# Altium footprint library 15EDG.PcbLib: 46 footprints (part 2 of 3)
Each footprint in its own frame and in the unit in brackets; x right, y up, seen from the top. Pads: shape width x height; smd on the part's side, far side on the other; paste and mask are expansions set on the pad; w line width, h text height; cw(c..) or ccw(c..) is an arc to the next point about the centre after c.
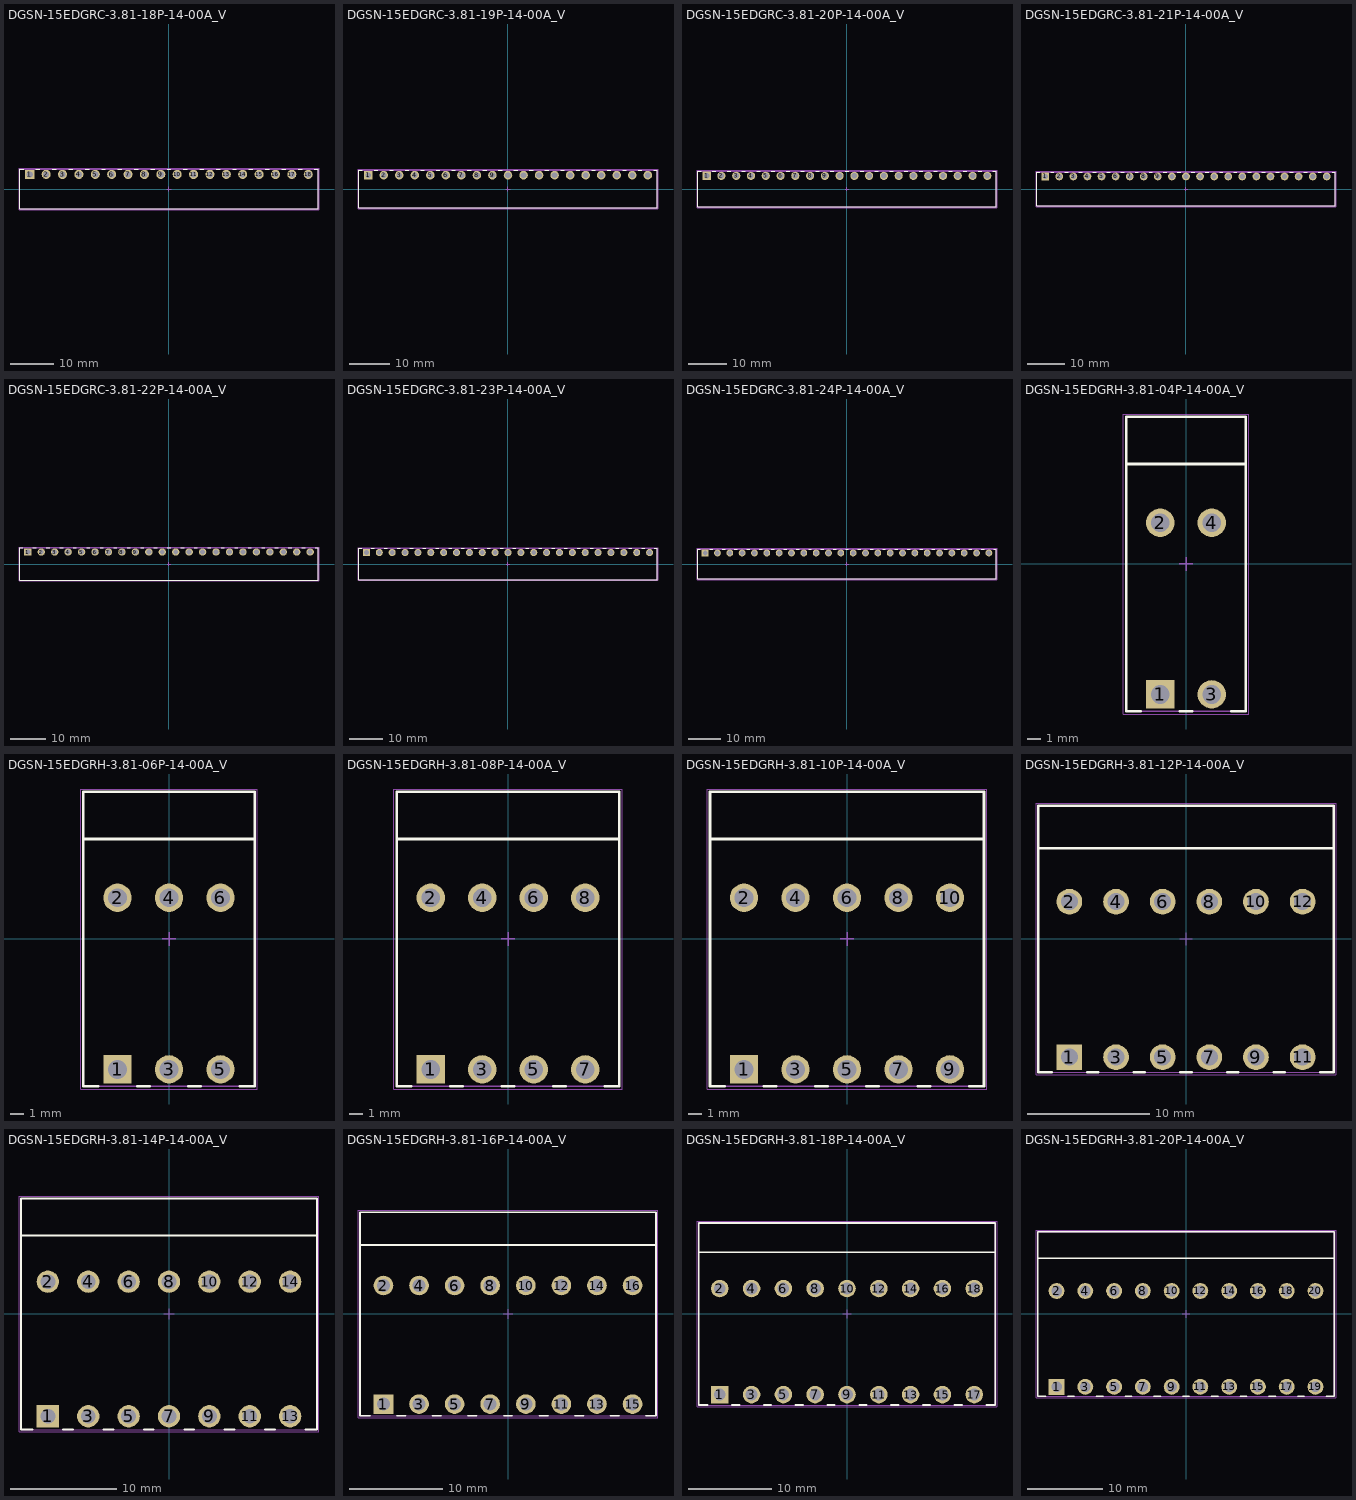
[diagram p1: the footprints below, top view; thin cyan lines are the x and y axes]

## DGSN-15EDGRC-3.81-18P-14-00A_V [mm] "Terminal Block, 18-Pin, Body 69.37x9.2mm, Pitch 3.81mm"
height 7.24
pads (18):
  rect 2.1x2.1 hole 1.4: 1(-32.385,3.4)
  round 2.1 hole 1.4: 2(-28.575,3.4) 3(-24.765,3.4) 4(-20.955,3.4) 5(-17.145,3.4) 6(-13.335,3.4) 7(-9.525,3.4) 8(-5.715,3.4) 9(-1.905,3.4) 10(1.905,3.4) 11(5.715,3.4) 12(9.525,3.4) 13(13.335,3.4) 14(17.145,3.4) 15(20.955,3.4) 16(24.765,3.4) 17(28.575,3.4) 18(32.385,3.4)
Top Overlay:
  lines w0.2: -33.835,4.6 -34.685,4.6 -34.685,-4.6 34.685,-4.6 34.685,4.6 33.835,4.6 ; -30.935,4.6 -30.025,4.6 ; -27.125,4.6 -26.215,4.6 ; -23.315,4.6 -22.405,4.6 ; -19.505,4.6 -18.595,4.6 ; -15.695,4.6 -14.785,4.6 ; -11.885,4.6 -10.975,4.6 ; -8.075,4.6 -7.165,4.6 ; -4.265,4.6 -3.355,4.6 ; -0.455,4.6 0.455,4.6 ; 3.355,4.6 4.265,4.6 ; 7.165,4.6 8.075,4.6 ; 10.975,4.6 11.885,4.6 ; 14.785,4.6 15.695,4.6 ; 18.595,4.6 19.505,4.6 ; 22.405,4.6 23.315,4.6 ; 26.215,4.6 27.125,4.6 ; 30.025,4.6 30.935,4.6
Mechanical 13:
  lines w0.1: -34.685,-4.6 34.685,-4.6 34.685,4.6 -34.685,4.6 -34.685,-4.6
Mechanical 15:
  lines w0.05: -34.885,-4.8 -34.885,4.8 ; -34.885,-4.8 34.885,-4.8 34.885,4.8 -34.885,4.8
  lines w0.1: -0.5,0 0.5,0 ; 0,-0.5 0,0.5
3D body "15EDGRC-3.81-18P-14-00AH.STEP": height 7.2, standoff -3.4, extent -34.685,-4.6 34.685,4.6

## DGSN-15EDGRC-3.81-19P-14-00A_V [mm] "Terminal Block, 19-Pin, Body 73.18x9.2mm, Pitch 3.81mm"
height 7.24
pads (19):
  rect 2.1x2.1 hole 1.4: 1(-34.29,3.4)
  round 2.1 hole 1.4: 2(-30.48,3.4) 3(-26.67,3.4) 4(-22.86,3.4) 5(-19.05,3.4) 6(-15.24,3.4) 7(-11.43,3.4) 8(-7.62,3.4) 9(-3.81,3.4) 10(0,3.4) 11(3.81,3.4) 12(7.62,3.4) 13(11.43,3.4) 14(15.24,3.4) 15(19.05,3.4) 16(22.86,3.4) 17(26.67,3.4) 18(30.48,3.4) 19(34.29,3.4)
Top Overlay:
  lines w0.2: -35.74,4.6 -36.59,4.6 -36.59,-4.6 36.59,-4.6 36.59,4.6 35.74,4.6 ; -32.84,4.6 -31.93,4.6 ; -29.03,4.6 -28.12,4.6 ; -25.22,4.6 -24.31,4.6 ; -21.41,4.6 -20.5,4.6 ; -17.6,4.6 -16.69,4.6 ; -13.79,4.6 -12.88,4.6 ; -9.98,4.6 -9.07,4.6 ; -6.17,4.6 -5.26,4.6 ; -2.36,4.6 -1.45,4.6 ; 1.45,4.6 2.36,4.6 ; 5.26,4.6 6.17,4.6 ; 9.07,4.6 9.98,4.6 ; 12.88,4.6 13.79,4.6 ; 16.69,4.6 17.6,4.6 ; 20.5,4.6 21.41,4.6 ; 24.31,4.6 25.22,4.6 ; 28.12,4.6 29.03,4.6 ; 31.93,4.6 32.84,4.6
Mechanical 13:
  lines w0.1: -36.59,-4.6 36.59,-4.6 36.59,4.6 -36.59,4.6 -36.59,-4.6
Mechanical 15:
  lines w0.05: -36.79,-4.8 -36.79,4.8 ; -36.79,-4.8 36.79,-4.8 36.79,4.8 -36.79,4.8
  lines w0.1: -0.5,0 0.5,0 ; 0,-0.5 0,0.5
3D body "15EDGRC-3.81-19P-14-00AH.STEP": height 7.2, standoff -3.4, extent -36.59,-4.6 36.59,4.6

## DGSN-15EDGRC-3.81-20P-14-00A_V [mm] "Terminal Block, 20-Pin, Body 76.99x9.2mm, Pitch 3.81mm"
height 7.24
pads (20):
  rect 2.1x2.1 hole 1.4: 1(-36.195,3.4)
  round 2.1 hole 1.4: 2(-32.385,3.4) 3(-28.575,3.4) 4(-24.765,3.4) 5(-20.955,3.4) 6(-17.145,3.4) 7(-13.335,3.4) 8(-9.525,3.4) 9(-5.715,3.4) 10(-1.905,3.4) 11(1.905,3.4) 12(5.715,3.4) 13(9.525,3.4) 14(13.335,3.4) 15(17.145,3.4) 16(20.955,3.4) 17(24.765,3.4) 18(28.575,3.4) 19(32.385,3.4) 20(36.195,3.4)
Top Overlay:
  lines w0.2: -37.645,4.6 -38.495,4.6 -38.495,-4.6 38.495,-4.6 38.495,4.6 37.645,4.6 ; -34.745,4.6 -33.835,4.6 ; -30.935,4.6 -30.025,4.6 ; -27.125,4.6 -26.215,4.6 ; -23.315,4.6 -22.405,4.6 ; -19.505,4.6 -18.595,4.6 ; -15.695,4.6 -14.785,4.6 ; -11.885,4.6 -10.975,4.6 ; -8.075,4.6 -7.165,4.6 ; -4.265,4.6 -3.355,4.6 ; -0.455,4.6 0.455,4.6 ; 3.355,4.6 4.265,4.6 ; 7.165,4.6 8.075,4.6 ; 10.975,4.6 11.885,4.6 ; 14.785,4.6 15.695,4.6 ; 18.595,4.6 19.505,4.6 ; 22.405,4.6 23.315,4.6 ; 26.215,4.6 27.125,4.6 ; 30.025,4.6 30.935,4.6 ; 33.835,4.6 34.745,4.6
Mechanical 13:
  lines w0.1: -38.495,-4.6 38.495,-4.6 38.495,4.6 -38.495,4.6 -38.495,-4.6
Mechanical 15:
  lines w0.05: -38.695,-4.8 -38.695,4.8 ; -38.695,-4.8 38.695,-4.8 38.695,4.8 -38.695,4.8
  lines w0.1: -0.5,0 0.5,0 ; 0,-0.5 0,0.5
3D body "15EDGRC-3.81-20P-14-00AH.STEP": height 7.2, standoff -3.4, extent -38.495,-4.6 38.495,4.6

## DGSN-15EDGRC-3.81-21P-14-00A_V [mm] "Terminal Block, 21-Pin, Body 80.80x9.2mm, Pitch 3.81mm"
height 7.24
pads (21):
  rect 2.1x2.1 hole 1.4: 1(-38.1,3.4)
  round 2.1 hole 1.4: 2(-34.29,3.4) 3(-30.48,3.4) 4(-26.67,3.4) 5(-22.86,3.4) 6(-19.05,3.4) 7(-15.24,3.4) 8(-11.43,3.4) 9(-7.62,3.4) 10(-3.81,3.4) 11(0,3.4) 12(3.81,3.4) 13(7.62,3.4) 14(11.43,3.4) 15(15.24,3.4) 16(19.05,3.4) 17(22.86,3.4) 18(26.67,3.4) 19(30.48,3.4) 20(34.29,3.4) 21(38.1,3.4)
Top Overlay:
  lines w0.2: -39.55,4.6 -40.4,4.6 -40.4,-4.6 40.4,-4.6 40.4,4.6 39.55,4.6 ; -36.65,4.6 -35.74,4.6 ; -32.84,4.6 -31.93,4.6 ; -29.03,4.6 -28.12,4.6 ; -25.22,4.6 -24.31,4.6 ; -21.41,4.6 -20.5,4.6 ; -17.6,4.6 -16.69,4.6 ; -13.79,4.6 -12.88,4.6 ; -9.98,4.6 -9.07,4.6 ; -6.17,4.6 -5.26,4.6 ; -2.36,4.6 -1.45,4.6 ; 1.45,4.6 2.36,4.6 ; 5.26,4.6 6.17,4.6 ; 9.07,4.6 9.98,4.6 ; 12.88,4.6 13.79,4.6 ; 16.69,4.6 17.6,4.6 ; 20.5,4.6 21.41,4.6 ; 24.31,4.6 25.22,4.6 ; 28.12,4.6 29.03,4.6 ; 31.93,4.6 32.84,4.6 ; 35.74,4.6 36.65,4.6
Mechanical 13:
  lines w0.1: -40.4,-4.6 40.4,-4.6 40.4,4.6 -40.4,4.6 -40.4,-4.6
Mechanical 15:
  lines w0.05: -40.6,-4.8 -40.6,4.8 ; -40.6,-4.8 40.6,-4.8 40.6,4.8 -40.6,4.8
  lines w0.1: -0.5,0 0.5,0 ; 0,-0.5 0,0.5
3D body "15EDGRC-3.81-21P-14-00AH.STEP": height 7.2, standoff -3.4, extent -40.4,-4.6 40.4,4.6

## DGSN-15EDGRC-3.81-22P-14-00A_V [mm] "Terminal Block, 22-Pin, Body 84.61x9.2mm, Pitch 3.81mm"
height 7.24
pads (22):
  rect 2.1x2.1 hole 1.4: 1(-40.005,3.4)
  round 2.1 hole 1.4: 2(-36.195,3.4) 3(-32.385,3.4) 4(-28.575,3.4) 5(-24.765,3.4) 6(-20.955,3.4) 7(-17.145,3.4) 8(-13.335,3.4) 9(-9.525,3.4) 10(-5.715,3.4) 11(-1.905,3.4) 12(1.905,3.4) 13(5.715,3.4) 14(9.525,3.4) 15(13.335,3.4) 16(17.145,3.4) 17(20.955,3.4) 18(24.765,3.4) 19(28.575,3.4) 20(32.385,3.4) 21(36.195,3.4) 22(40.005,3.4)
Top Overlay:
  lines w0.2: -41.455,4.6 -42.305,4.6 -42.305,-4.6 42.305,-4.6 42.305,4.6 41.455,4.6 ; -38.555,4.6 -37.645,4.6 ; -34.745,4.6 -33.835,4.6 ; -30.935,4.6 -30.025,4.6 ; -27.125,4.6 -26.215,4.6 ; -23.315,4.6 -22.405,4.6 ; -19.505,4.6 -18.595,4.6 ; -15.695,4.6 -14.785,4.6 ; -11.885,4.6 -10.975,4.6 ; -8.075,4.6 -7.165,4.6 ; -4.265,4.6 -3.355,4.6 ; -0.455,4.6 0.455,4.6 ; 3.355,4.6 4.265,4.6 ; 7.165,4.6 8.075,4.6 ; 10.975,4.6 11.885,4.6 ; 14.785,4.6 15.695,4.6 ; 18.595,4.6 19.505,4.6 ; 22.405,4.6 23.315,4.6 ; 26.215,4.6 27.125,4.6 ; 30.025,4.6 30.935,4.6 ; 33.835,4.6 34.745,4.6 ; 37.645,4.6 38.555,4.6
Mechanical 13:
  lines w0.1: -42.305,-4.6 -42.305,4.6 42.305,4.6 42.305,-4.6 -42.305,-4.6
Mechanical 15:
  lines w0.05: -42.505,-4.8 -42.505,4.8 ; -42.505,-4.8 42.505,-4.8 42.505,4.8 -42.505,4.8
  lines w0.1: -0.5,0 0.5,0 ; 0,-0.5 0,0.5
3D body "15EDGRC-3.81-22P-14-00AH.STEP": height 7.2, standoff -3.4, extent -42.305,-4.6 42.305,4.6

## DGSN-15EDGRC-3.81-23P-14-00A_V [mm] "Terminal Block, 23-Pin, Body 88.42x9.2mm, Pitch 3.81mm"
height 7.24
pads (23):
  rect 2.1x2.1 hole 1.4: 1(-41.91,3.4)
  round 2.1 hole 1.4: 2(-38.1,3.4) 3(-34.29,3.4) 4(-30.48,3.4) 5(-26.67,3.4) 6(-22.86,3.4) 7(-19.05,3.4) 8(-15.24,3.4) 9(-11.43,3.4) 10(-7.62,3.4) 11(-3.81,3.4) 12(0,3.4) 13(3.81,3.4) 14(7.62,3.4) 15(11.43,3.4) 16(15.24,3.4) 17(19.05,3.4) 18(22.86,3.4) 19(26.67,3.4) 20(30.48,3.4) 21(34.29,3.4) 22(38.1,3.4) 23(41.91,3.4)
Top Overlay:
  lines w0.2: -43.36,4.6 -44.21,4.6 -44.21,-4.6 44.21,-4.6 44.21,4.6 43.36,4.6 ; -40.46,4.6 -39.55,4.6 ; -36.65,4.6 -35.74,4.6 ; -32.84,4.6 -31.93,4.6 ; -29.03,4.6 -28.12,4.6 ; -25.22,4.6 -24.31,4.6 ; -21.41,4.6 -20.5,4.6 ; -17.6,4.6 -16.69,4.6 ; -13.79,4.6 -12.88,4.6 ; -9.98,4.6 -9.07,4.6 ; -6.17,4.6 -5.26,4.6 ; -2.36,4.6 -1.45,4.6 ; 1.45,4.6 2.36,4.6 ; 5.26,4.6 6.17,4.6 ; 9.07,4.6 9.98,4.6 ; 12.88,4.6 13.79,4.6 ; 16.69,4.6 17.6,4.6 ; 20.5,4.6 21.41,4.6 ; 24.31,4.6 25.22,4.6 ; 28.12,4.6 29.03,4.6 ; 31.93,4.6 32.84,4.6 ; 35.74,4.6 36.65,4.6 ; 39.55,4.6 40.46,4.6
Mechanical 13:
  lines w0.1: -44.21,-4.6 44.21,-4.6 44.21,4.6 -44.21,4.6 -44.21,-4.6
Mechanical 15:
  lines w0.05: -44.41,-4.8 -44.41,4.8 ; -44.41,-4.8 44.41,-4.8 44.41,4.8 -44.41,4.8
  lines w0.1: -0.5,0 0.5,0 ; 0,-0.5 0,0.5
3D body "15EDGRC-3.81-23P-14-00AH.STEP": height 7.2, standoff -3.4, extent -44.21,-4.6 44.21,4.6

## DGSN-15EDGRC-3.81-24P-14-00A_V [mm] "Terminal Block, 24-Pin, Body 92.23x9.2mm, Pitch 3.81mm"
height 7.24
pads (24):
  rect 2.1x2.1 hole 1.4: 1(-43.815,3.4)
  round 2.1 hole 1.4: 2(-40.005,3.4) 3(-36.195,3.4) 4(-32.385,3.4) 5(-28.575,3.4) 6(-24.765,3.4) 7(-20.955,3.4) 8(-17.145,3.4) 9(-13.335,3.4) 10(-9.525,3.4) 11(-5.715,3.4) 12(-1.905,3.4) 13(1.905,3.4) 14(5.715,3.4) 15(9.525,3.4) 16(13.335,3.4) 17(17.145,3.4) 18(20.955,3.4) 19(24.765,3.4) 20(28.575,3.4) 21(32.385,3.4) 22(36.195,3.4) 23(40.005,3.4) 24(43.815,3.4)
Top Overlay:
  lines w0.2: -45.265,4.6 -46.115,4.6 -46.115,-4.6 46.115,-4.6 46.115,4.6 45.265,4.6 ; -42.365,4.6 -41.455,4.6 ; -38.555,4.6 -37.645,4.6 ; -34.745,4.6 -33.835,4.6 ; -30.935,4.6 -30.025,4.6 ; -27.125,4.6 -26.215,4.6 ; -23.315,4.6 -22.405,4.6 ; -19.505,4.6 -18.595,4.6 ; -15.695,4.6 -14.785,4.6 ; -11.885,4.6 -10.975,4.6 ; -8.075,4.6 -7.165,4.6 ; -4.265,4.6 -3.355,4.6 ; -0.455,4.6 0.455,4.6 ; 3.355,4.6 4.265,4.6 ; 7.165,4.6 8.075,4.6 ; 10.975,4.6 11.885,4.6 ; 14.785,4.6 15.695,4.6 ; 18.595,4.6 19.505,4.6 ; 22.405,4.6 23.315,4.6 ; 26.215,4.6 27.125,4.6 ; 30.025,4.6 30.935,4.6 ; 33.835,4.6 34.745,4.6 ; 37.645,4.6 38.555,4.6 ; 41.455,4.6 42.365,4.6
Mechanical 13:
  lines w0.1: -46.115,-4.6 -46.115,4.6 46.115,4.6 46.115,-4.6 -46.115,-4.6
Mechanical 15:
  lines w0.05: -46.315,-4.8 -46.315,4.8 ; -46.315,-4.8 46.315,-4.8 46.315,4.8 -46.315,4.8
  lines w0.1: -0.5,0 0.5,0 ; 0,-0.5 0,0.5
3D body "15EDGRC-3.81-24P-14-00AH.STEP": height 7.2, standoff -3.4, extent -46.115,-4.6 46.115,4.6

## DGSN-15EDGRH-3.81-04P-14-00A_V [mm] "Terminal Block, 04-Pin, Body 8.86x21.80mm, Pitch 3.81mm"
height 22.7
pads (4):
  rect 2.1x2.1 hole 1.4: 1(-1.905,-9.65)
  round 2.1 hole 1.4: 2(-1.905,3.05) 3(1.905,-9.65) 4(1.905,3.05)
Top Overlay:
  lines w0.2: -4.43,7.4 4.43,7.4 ; -3.355,-10.9 -4.43,-10.9 -4.43,10.9 4.43,10.9 4.43,-10.9 3.355,-10.9 ; -0.455,-10.9 0.455,-10.9
Mechanical 13:
  lines w0.1: -4.43,-10.9 -4.43,10.9 4.43,10.9 4.43,-10.9 -4.43,-10.9
Mechanical 15:
  lines w0.05: -4.63,-11.1 -4.63,11.1 4.63,11.1 4.63,-11.1 -4.63,-11.1
  lines w0.1: -0.5,0 0.5,0 ; 0,-0.5 0,0.5
3D body "15EDGRH-3.81-04P-14-00AH.STEP": height 22.7, standoff -3.5, extent -4.42,-10.9 4.43,10.9

## DGSN-15EDGRH-3.81-06P-14-00A_V [mm] "Terminal Block, 06-Pin, Body 12.67x21.80mm, Pitch 3.81mm"
height 22.7
pads (6):
  rect 2.1x2.1 hole 1.4: 1(-3.81,-9.65)
  round 2.1 hole 1.4: 2(-3.81,3.05) 3(0,-9.65) 4(0,3.05) 5(3.81,-9.65) 6(3.81,3.05)
Top Overlay:
  lines w0.2: -6.335,7.4 6.335,7.4 ; -5.26,-10.9 -6.335,-10.9 -6.335,10.9 6.335,10.9 6.335,-10.9 5.26,-10.9 ; -2.36,-10.9 -1.45,-10.9 ; 1.45,-10.9 2.36,-10.9
Mechanical 13:
  lines w0.1: -6.335,-10.9 6.335,-10.9 6.335,10.9 -6.335,10.9 -6.335,-10.9
Mechanical 15:
  lines w0.05: -6.535,-11.1 6.535,-11.1 6.535,11.1 -6.535,11.1 -6.535,-11.1
  lines w0.1: -0.5,0 0.5,0 ; 0,-0.5 0,0.5
3D body "15EDGRH-3.81-06P-14-00AH.STEP": height 22.7, standoff -3.5, extent -6.325,-10.9 6.335,10.9

## DGSN-15EDGRH-3.81-08P-14-00A_V [mm] "Terminal Block, 08-Pin, Body 16.48x21.80mm, Pitch 3.81mm"
height 22.7
pads (8):
  rect 2.1x2.1 hole 1.4: 1(-5.715,-9.65)
  round 2.1 hole 1.4: 2(-5.715,3.05) 3(-1.905,-9.65) 4(-1.905,3.05) 5(1.905,-9.65) 6(1.905,3.05) 7(5.715,-9.65) 8(5.715,3.05)
Top Overlay:
  lines w0.2: -8.24,7.4 8.24,7.4 ; -7.165,-10.9 -8.24,-10.9 -8.24,10.9 8.24,10.9 8.24,-10.9 7.165,-10.9 ; -4.265,-10.9 -3.355,-10.9 ; -0.455,-10.9 0.455,-10.9 ; 3.355,-10.9 4.265,-10.9
Mechanical 13:
  lines w0.1: -8.24,-10.9 8.24,-10.9 8.24,10.9 -8.24,10.9 -8.24,-10.9
Mechanical 15:
  lines w0.05: -8.44,-11.1 8.44,-11.1 8.44,11.1 -8.44,11.1 -8.44,-11.1
  lines w0.1: -0.5,0 0.5,0 ; 0,-0.5 0,0.5
3D body "15EDGRH-3.81-08P-14-00AH.STEP": height 22.7, standoff -3.5, extent -8.23,-10.9 8.24,10.9

## DGSN-15EDGRH-3.81-10P-14-00A_V [mm] "Terminal Block, 10-Pin, Body 20.29x21.80mm, Pitch 3.81mm"
height 22.7
pads (10):
  rect 2.1x2.1 hole 1.4: 1(-7.62,-9.65)
  round 2.1 hole 1.4: 2(-7.62,3.05) 3(-3.81,-9.65) 4(-3.81,3.05) 5(0,-9.65) 6(0,3.05) 7(3.81,-9.65) 8(3.81,3.05) 9(7.62,-9.65) 10(7.62,3.05)
Top Overlay:
  lines w0.2: -10.145,7.4 10.145,7.4 ; -9.07,-10.9 -10.145,-10.9 -10.145,10.9 10.145,10.9 10.145,-10.9 9.07,-10.9 ; -6.17,-10.9 -5.26,-10.9 ; -2.36,-10.9 -1.45,-10.9 ; 1.45,-10.9 2.36,-10.9 ; 5.26,-10.9 6.17,-10.9
Mechanical 13:
  lines w0.1: -10.145,-10.9 10.145,-10.9 10.145,10.9 -10.145,10.9 -10.145,-10.9
Mechanical 15:
  lines w0.05: -10.345,-11.1 10.345,-11.1 10.345,11.1 -10.345,11.1 -10.345,-11.1
  lines w0.1: -0.5,0 0.5,0 ; 0,-0.5 0,0.5
3D body "15EDGRH-3.81-10P-14-00AH.STEP": height 22.7, standoff -3.5, extent -10.135,-10.9 10.145,10.9

## DGSN-15EDGRH-3.81-12P-14-00A_V [mm] "Terminal Block, 12-Pin, Body 24.10x21.80mm, Pitch 3.81mm"
height 22.7
pads (12):
  rect 2.1x2.1 hole 1.4: 1(-9.525,-9.65)
  round 2.1 hole 1.4: 2(-9.525,3.05) 3(-5.715,-9.65) 4(-5.715,3.05) 5(-1.905,-9.65) 6(-1.905,3.05) 7(1.905,-9.65) 8(1.905,3.05) 9(5.715,-9.65) 10(5.715,3.05) 11(9.525,-9.65) 12(9.525,3.05)
Top Overlay:
  lines w0.2: -12.05,7.4 12.05,7.4 ; -10.975,-10.9 -12.05,-10.9 -12.05,10.9 12.05,10.9 12.05,-10.9 10.975,-10.9 ; -8.075,-10.9 -7.165,-10.9 ; -4.265,-10.9 -3.355,-10.9 ; -0.455,-10.9 0.455,-10.9 ; 3.355,-10.9 4.265,-10.9 ; 7.165,-10.9 8.075,-10.9
Mechanical 13:
  lines w0.1: -12.05,-10.9 12.05,-10.9 12.05,10.9 -12.05,10.9 -12.05,-10.9
Mechanical 15:
  lines w0.05: -12.25,-11.1 12.25,-11.1 12.25,11.1 -12.25,11.1 -12.25,-11.1
  lines w0.1: -0.5,0 0.5,0 ; 0,-0.5 0,0.5
3D body "15EDGRH-3.81-12P-14-00AH.STEP": height 22.7, standoff -3.5, extent -12.04,-10.9 12.05,10.9

## DGSN-15EDGRH-3.81-14P-14-00A_V [mm] "Terminal Block, 14-Pin, Body 27.91x21.80mm, Pitch 3.81mm"
height 22.7
pads (14):
  rect 2.1x2.1 hole 1.4: 1(-11.43,-9.65)
  round 2.1 hole 1.4: 2(-11.43,3.05) 3(-7.62,-9.65) 4(-7.62,3.05) 5(-3.81,-9.65) 6(-3.81,3.05) 7(0,-9.65) 8(0,3.05) 9(3.81,-9.65) 10(3.81,3.05) 11(7.62,-9.65) 12(7.62,3.05) 13(11.43,-9.65) 14(11.43,3.05)
Top Overlay:
  lines w0.2: -13.955,7.4 13.955,7.4 ; -12.88,-10.9 -13.955,-10.9 -13.955,10.9 13.955,10.9 13.955,-10.9 12.88,-10.9 ; -9.98,-10.9 -9.07,-10.9 ; -6.17,-10.9 -5.26,-10.9 ; -2.36,-10.9 -1.45,-10.9 ; 1.45,-10.9 2.36,-10.9 ; 5.26,-10.9 6.17,-10.9 ; 9.07,-10.9 9.98,-10.9
Mechanical 13:
  lines w0.1: -13.955,-10.9 13.955,-10.9 13.955,10.9 -13.955,10.9 -13.955,-10.9
Mechanical 15:
  lines w0.05: -14.155,-11.1 14.155,-11.1 14.155,11.1 -14.155,11.1 -14.155,-11.1
  lines w0.1: -0.5,0 0.5,0 ; 0,-0.5 0,0.5
3D body "15EDGRH-3.81-14P-14-00AH.STEP": height 22.7, standoff -3.5, extent -13.945,-10.9 13.955,10.9

## DGSN-15EDGRH-3.81-16P-14-00A_V [mm] "Terminal Block, 16-Pin, Body 31.72x21.80mm, Pitch 3.81mm"
height 22.7
pads (16):
  rect 2.1x2.1 hole 1.4: 1(-13.335,-9.65)
  round 2.1 hole 1.4: 2(-13.335,3.05) 3(-9.525,-9.65) 4(-9.525,3.05) 5(-5.715,-9.65) 6(-5.715,3.05) 7(-1.905,-9.65) 8(-1.905,3.05) 9(1.905,-9.65) 10(1.905,3.05) 11(5.715,-9.65) 12(5.715,3.05) 13(9.525,-9.65) 14(9.525,3.05) 15(13.335,-9.65) 16(13.335,3.05)
Top Overlay:
  lines w0.2: -15.86,7.4 15.86,7.4 ; -14.785,-10.9 -15.86,-10.9 -15.86,10.9 15.86,10.9 15.86,-10.9 14.785,-10.9 ; -11.885,-10.9 -10.975,-10.9 ; -8.075,-10.9 -7.165,-10.9 ; -4.265,-10.9 -3.355,-10.9 ; -0.455,-10.9 0.455,-10.9 ; 3.355,-10.9 4.265,-10.9 ; 7.165,-10.9 8.075,-10.9 ; 10.975,-10.9 11.885,-10.9
Mechanical 13:
  lines w0.1: -15.86,-10.9 -15.86,10.9 15.86,10.9 15.86,-10.9 -15.86,-10.9
Mechanical 15:
  lines w0.05: -16.06,-11.1 -16.06,11.1 16.06,11.1 16.06,-11.1 -16.06,-11.1
  lines w0.1: -0.5,0 0.5,0 ; 0,-0.5 0,0.5
3D body "15EDGRH-3.81-16P-14-00AH.STEP": height 22.7, standoff -3.5, extent -15.85,-10.9 15.86,10.9

## DGSN-15EDGRH-3.81-18P-14-00A_V [mm] "Terminal Block, 18-Pin, Body 35.53x21.80mm, Pitch 3.81mm"
height 22.7
pads (18):
  rect 2.1x2.1 hole 1.4: 1(-15.24,-9.65)
  round 2.1 hole 1.4: 2(-15.24,3.05) 3(-11.43,-9.65) 4(-11.43,3.05) 5(-7.62,-9.65) 6(-7.62,3.05) 7(-3.81,-9.65) 8(-3.81,3.05) 9(0,-9.65) 10(0,3.05) 11(3.81,-9.65) 12(3.81,3.05) 13(7.62,-9.65) 14(7.62,3.05) 15(11.43,-9.65) 16(11.43,3.05) 17(15.24,-9.65) 18(15.24,3.05)
Top Overlay:
  lines w0.2: -17.765,7.4 17.765,7.4 ; -16.69,-10.9 -17.765,-10.9 -17.765,10.9 17.765,10.9 17.765,-10.9 16.69,-10.9 ; -13.79,-10.9 -12.88,-10.9 ; -9.98,-10.9 -9.07,-10.9 ; -6.17,-10.9 -5.26,-10.9 ; -2.36,-10.9 -1.45,-10.9 ; 1.45,-10.9 2.36,-10.9 ; 5.26,-10.9 6.17,-10.9 ; 9.07,-10.9 9.98,-10.9 ; 12.88,-10.9 13.79,-10.9
Mechanical 13:
  lines w0.1: -17.765,-10.9 -17.765,10.9 17.765,10.9 17.765,-10.9 -17.765,-10.9
Mechanical 15:
  lines w0.05: -17.965,-11.1 -17.965,11.1 17.965,11.1 17.965,-11.1 -17.965,-11.1
  lines w0.1: -0.5,0 0.5,0 ; 0,-0.5 0,0.5
3D body "15EDGRH-3.81-18P-14-00AH.STEP": height 22.7, standoff -3.5, extent -17.755,-10.9 17.765,10.9

## DGSN-15EDGRH-3.81-20P-14-00A_V [mm] "Terminal Block, 20-Pin, Body 39.34x21.80mm, Pitch 3.81mm"
height 22.7
pads (20):
  rect 2.1x2.1 hole 1.4: 1(-17.145,-9.65)
  round 2.1 hole 1.4: 2(-17.145,3.05) 3(-13.335,-9.65) 4(-13.335,3.05) 5(-9.525,-9.65) 6(-9.525,3.05) 7(-5.715,-9.65) 8(-5.715,3.05) 9(-1.905,-9.65) 10(-1.905,3.05) 11(1.905,-9.65) 12(1.905,3.05) 13(5.715,-9.65) 14(5.715,3.05) 15(9.525,-9.65) 16(9.525,3.05) 17(13.335,-9.65) 18(13.335,3.05) 19(17.145,-9.65) 20(17.145,3.05)
Top Overlay:
  lines w0.2: -19.67,7.4 19.67,7.4 ; -18.595,-10.9 -19.67,-10.9 -19.67,10.9 19.67,10.9 19.67,-10.9 18.595,-10.9 ; -15.695,-10.9 -14.785,-10.9 ; -11.885,-10.9 -10.975,-10.9 ; -8.075,-10.9 -7.165,-10.9 ; -4.265,-10.9 -3.355,-10.9 ; -0.455,-10.9 0.455,-10.9 ; 3.355,-10.9 4.265,-10.9 ; 7.165,-10.9 8.075,-10.9 ; 10.975,-10.9 11.885,-10.9 ; 14.785,-10.9 15.695,-10.9
Mechanical 13:
  lines w0.1: -19.67,-10.9 -19.67,10.9 19.67,10.9 19.67,-10.9 -19.67,-10.9
Mechanical 15:
  lines w0.05: -19.87,-11.1 -19.87,11.1 19.87,11.1 19.87,-11.1 -19.87,-11.1
  lines w0.1: -0.5,0 0.5,0 ; 0,-0.5 0,0.5
3D body "15EDGRH-3.81-20P-14-00AH.STEP": height 22.7, standoff -3.5, extent -19.66,-10.9 19.67,10.9